# Altium footprint library Tienanh.PcbLib: 190 footprints (part 7 of 12)
Each footprint in its own frame and in the unit in brackets; x right, y up, seen from the top. Pads: shape width x height; smd on the part's side, far side on the other; paste and mask are expansions set on the pad; w line width, h text height; cw(c..) or ccw(c..) is an arc to the next point about the centre after c.
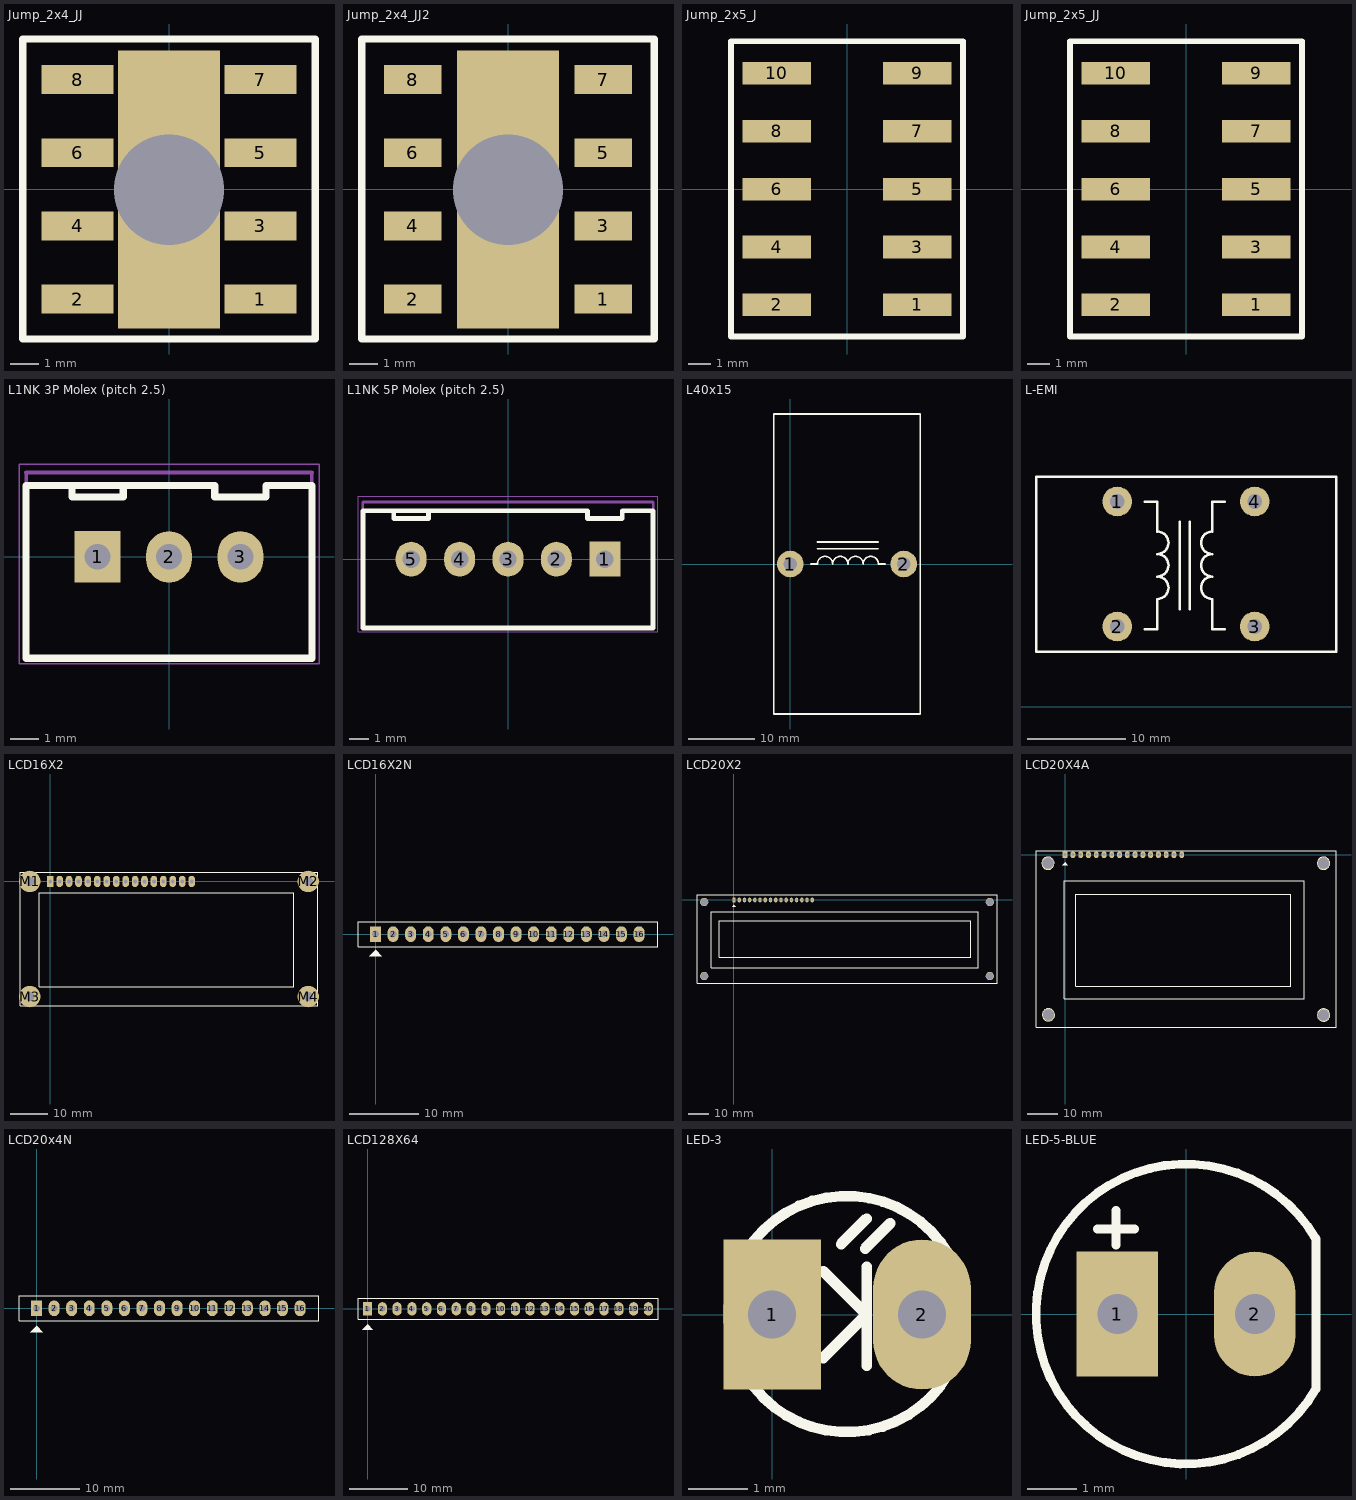
[diagram p6: the footprints below, top view; thin cyan lines are the x and y axes]

## Jump_2x4_JJ [mm]
pads (9):
  rect 2.5x1 smd: 1(3.175,-3.81) 2(-3.175,-3.81) 3(3.175,-1.27) 4(-3.175,-1.27) 5(3.175,1.27) 6(-3.175,1.27) 7(3.175,3.81) 8(-3.175,3.81)
  rect 3.556x9.652 hole 3.835 square: ""(0,-0.006)
Top Overlay:
  lines w0.254: -5.08,-5.194 5.08,-5.194 5.08,5.22 -5.08,5.22 -5.08,-5.194
3D body "BG180-08-A-0-N-C.stp": height 7.51, standoff 0.01, extent -3.4,-5.086 3.4,5.074

## Jump_2x4_JJ2 [mm]
pads (9):
  rect 2x1 smd: 1(3.302,-3.81) 2(-3.302,-3.81) 3(3.302,-1.27) 4(-3.302,-1.27) 5(3.302,1.27) 6(-3.302,1.27) 7(3.302,3.81) 8(-3.302,3.81)
  rect 3.556x9.652 hole 3.835 square: ""(0,-0.006)
Top Overlay:
  lines w0.254: -5.08,-5.194 -5.08,5.22 5.08,5.22 5.08,-5.194 -5.08,-5.194
3D body "BG180-08-A-0-N-C.stp": height 7.51, standoff 0.01, extent -3.4,-5.086 3.4,5.074

## Jump_2x5_J [mm]
pads (10):
  rect 3x1 smd: 1(3.073,-5.077) 2(-3.073,-5.077) 3(3.073,-2.543) 4(-3.073,-2.543) 5(3.073,-0.01) 6(-3.073,-0.01) 7(3.073,2.53) 8(-3.073,2.53) 9(3.073,5.077) 10(-3.073,5.077)
Top Overlay:
  lines w0.254: -5.08,-6.461 5.08,-6.461 5.08,6.474 -5.08,6.474 -5.08,-6.461
3D body "BG050-10A-0-1500-0737-0350-L-B.stp": height 18.51, standoff 0.01, extent -3.685,-6.353 3.685,6.347

## Jump_2x5_JJ [mm]
pads (10):
  rect 3x1 smd: 1(3.073,-5.077) 2(-3.073,-5.077) 3(3.073,-2.543) 4(-3.073,-2.543) 5(3.073,-0.01) 6(-3.073,-0.01) 7(3.073,2.53) 8(-3.073,2.53) 9(3.073,5.077) 10(-3.073,5.077)
Top Overlay:
  lines w0.254: -5.08,-6.461 5.08,-6.461 5.08,6.474 -5.08,6.474 -5.08,-6.461
3D body "BG180-10-A-0-N-C.stp": height 7.51, standoff 0.01, extent -3.371,-6.353 3.429,6.347

## L1NK 3P Molex (pitch 2.5) [mm]
pads (3):
  rect 1.6x1.8 hole 0.9: 1(-2.5,0)
  oval 1.6x1.8 hole 0.9: 2(0,0) 3(2.5,0)
Top Overlay:
  lines w0.25: -4.1,2.5 1.6,2.5 1.6,2.1 3.4,2.1 3.4,2.5 5,2.5 5,-3.55 -5,-3.55 -5,2.5 -3.4,2.5 -3.4,2.1 -1.6,2.1 -1.6,2.5
Mechanical 13:
  lines w0.127: -5,-3.55 -5,2.95 ; 5,-3.55 5,2.95
  lines w0.15: -5,-3.55 5,-3.55 ; -5,2.95 5,2.95
Mechanical 15:
  lines w0.05: -5.25,-3.75 -5.25,3.25 5.25,3.25 5.25,-3.75 -5.25,-3.75
3D body "x8821wv-03l-n0sn.stp": height 7.2, standoff -3.4, extent -5,-3.554 5,2.95

## L1NK 5P Molex (pitch 2.5) [mm]
pads (5):
  rect 1.6x1.8 hole 0.9: 1(5,0)
  oval 1.6x1.8 hole 0.9: 2(2.5,0) 3(0,0) 4(-2.5,0) 5(-5,0)
Top Overlay:
  lines w0.25: -6.6,2.5 4.1,2.5 4.1,2.1 5.9,2.1 5.9,2.5 7.5,2.5 7.5,-3.55 -7.5,-3.55 -7.5,2.5 -5.9,2.5 -5.9,2.1 -4.1,2.1 -4.1,2.5
Mechanical 13:
  lines w0.127: -7.5,-3.55 -7.5,2.95 ; 7.5,-3.55 7.5,2.95
  lines w0.15: -7.5,-3.55 7.5,-3.55 ; -7.5,2.95 7.5,2.95
Mechanical 15:
  lines w0.05: 7.75,-3.75 7.75,3.25 -7.75,3.25 -7.75,-3.75 7.75,-3.75 ; 7.75,-3.75 7.75,-3.75
3D body "x8821wv-05l-n0sn.stp": height 2.8, standoff -7.8, extent -7.5,-3.55 7.5,2.954

## L40x15 [mm]
pads (2):
  round 4 hole 2: 1(0,0) 2(17.018,0)
Top Overlay:
  lines w0.254: 3.048,0 4.064,0 cw(c5.207,0) 6.35,0 cw(c7.493,0) 8.636,0 cw(c9.779,0) 10.922,0 cw(c12.065,0) 13.208,0 14.224,0 ; 4.064,2.286 13.208,2.286 ; 4.064,3.302 13.208,3.302 ; -2.5,-22.5 19.5,-22.5 19.5,22.5 -2.5,22.5 -2.5,-22.5

## L-EMI [mm]
pads (4):
  round 3 hole 1.5: 1(12.7,20.828) 2(12.7,8.128) 3(26.67,8.128) 4(26.67,20.828)
Top Overlay:
  lines w0.254: 15.494,7.874 16.764,7.874 16.764,10.922 ccw(c16.764,12.065) 16.764,13.208 ccw(c16.764,14.351) 16.764,15.494 ccw(c16.764,16.637) 16.764,17.78 16.764,20.828 15.494,20.828 ; 19.05,9.906 19.05,18.796 ; 20.066,9.906 20.066,18.796 ; 23.622,7.874 22.352,7.874 22.352,10.922 cw(c22.352,12.065) 22.352,13.208 cw(c22.352,14.351) 22.352,15.494 cw(c22.352,16.637) 22.352,17.78 22.352,20.828 23.622,20.828 ; 4.445,5.588 34.925,5.588 34.925,23.368 4.445,23.368 4.445,5.588

## LCD16X2 [mm] "LCD dipslay 16x2, 16 pin"
height 10.16
pads (20):
  rect 1.778x3.048 hole 1: 1(0,0)
  oval 1.778x3.048 hole 1: 2(2.54,0) 3(5.08,0) 4(7.62,0) 5(10.16,0) 6(12.7,0) 7(15.24,0) 8(17.78,0) 9(20.32,0) 10(22.86,0) 11(25.4,0) 12(27.94,0) 13(30.48,0) 14(33.02,0) 15(35.56,0) 16(38.1,0)
  round 5.8 / inner round 0 / far side round 0 hole 2.5 unplated: M1(-5.5,0) M2(69.5,0) M3(-5.5,-31) M4(69.5,-31)
Top Overlay:
  lines w0.2: -8,-33.5 -8,2.5 72,2.5 72,-33.5 -8,-33.5 ; -2.921,-28.423 -2.921,-3.023 65.659,-3.023 65.659,-28.423 -2.921,-28.423
3D body "socket16.stp": height 7.02, standoff -2.98, extent -1.207,-1.333 39.433,1.207
3D body "jp16.stp": height 11.89, standoff -0.51, extent -1.219,-1.321 39.321,1.179
3D body "LCD module 16 X 2 backlight.STEP": height 18.14, standoff 4.93, extent -8.128,-34.468 72.372,2.032

## LCD16X2N [mil] "LCD dipslay 16x2, 16 pin"
height 400
pads (16):
  rect 62x90 hole 39: 1(0,0)
  oval 62x90 hole 39: 2(100,0) 3(200,0) 4(300,0) 5(400,0) 6(500,0) 7(600,0) 8(700,0) 9(800,0) 10(900,0) 11(1000,0) 12(1100,0) 13(1200,0) 14(1300,0) 15(1400,0) 16(1500,0)
Top Overlay:
  region: 0,-90 -35,-125 35,-125
  lines w7: -100,-71 -100,70 1608,70 1608,-71 -100,-71
3D body "socket16.stp": height 276.19, standoff -117.51, extent -49,-49 1551,51
3D body "jp16.stp": height 468.11, standoff -20.08, extent -48.03,-48.43 1548.03,50
3D body "lcd16.STEP": height 764, standoff 244, extent -319.64,-1353.49 2849.65,83.51

## LCD20X2 [mil] "LCD dipslay 20x2, 16 pin"
height 400
pads (20):
  rect 62x90 hole 36: 1(0,0)
  oval 62x90 hole 36: 2(100,0) 3(200,0) 4(300,0) 5(400,0) 6(500,0) 7(600,0) 8(700,0) 9(800,0) 10(900,0) 11(1000,0) 12(1100,0) 13(1200,0) 14(1300,0) 15(1400,0) 16(1500,0)
  round 157.48 hole 137.8: "Hole 0"(-570.87,-1456.69) "Hole 0"(-570.87,-39.37) "Hole 0"(4901.57,-1456.69) "Hole 0"(4901.57,-39.37)
Top Overlay:
  region: 0,-90 -35,-125 35,-125
  lines w7: -708.66,-1594.49 -708.66,100 5039.37,100 5039.37,-1594.49 -708.66,-1594.49 ; -436,-1300 -436,-225 4682,-225 4682,-1300 -436,-1300 ; -286,-1100 -286,-400 4532,-400 4532,-1100 -286,-1100
3D body "SW3dPS-Display20x2.STEP": height 198, standoff -180, extent -100,-1437 4470,33

## LCD20X4A [mil] "LCD dipslay 20x4, 16 pin"
height 400
pads (20):
  rect 62x90 hole 39: 1(0,0)
  oval 62x90 hole 39: 2(100,0) 3(200,0) 4(300,0) 5(400,0) 6(500,0) 7(600,0) 8(700,0) 9(800,0) 10(900,0) 11(1000,0) 12(1100,0) 13(1200,0) 14(1300,0) 15(1400,0) 16(1500,0)
  round 157.48 hole 137.8: "Hole 0"(-220,-110) "Hole 0"(-215,-2060) "Hole 0"(3325,-2065) "Hole 0"(3325,-110)
Top Overlay:
  circle w7: c3324.94,-2063 r79.06
  circle w7: c3324.94,-110 r79.06
  circle w7: c-221.06,-110 r79.06
  circle w7: c-215.06,-2061 r79.06
  region: 0,-100 -35,-135 35,-135
  lines w7: -375,-2220 -375,50 3485,50 3485,-2220 -374,-2220 ; -11,-1852 -11,-337 3076,-337 3076,-1852 -11,-1852 ; 139,-1695 139,-512 2905,-512 2905,-1695 139,-1695
3D body "User Library-LCD20_4.STEP": height 417.32, standoff -125.98, extent -392.13,-2264.2 3466.13,98

## LCD20x4N [mil] "LCD dipslay 20x4, 16 pin"
height 400
pads (16):
  rect 62x90 hole 39: 1(0,0)
  oval 62x90 hole 39: 2(100,0) 3(200,0) 4(300,0) 5(400,0) 6(500,0) 7(600,0) 8(700,0) 9(800,0) 10(900,0) 11(1000,0) 12(1100,0) 13(1200,0) 14(1300,0) 15(1400,0) 16(1500,0)
Top Overlay:
  region: 0,-100 -35,-135 35,-135
  lines w7: -100,-71 1608,-71 1608,70 -100,70 -100,-71
3D body "User Library-LCD20_4.STEP": height 417.32, standoff -125.98, extent -392,-2265.2 3466.27,97

## LCD128X64 [mil] "LCD Graphic 128x64, 20 pin"
height 400
pads (20):
  rect 62x90 hole 39: 1(0,0)
  oval 62x90 hole 39: 2(100,0) 3(200,0) 4(300,0) 5(400,0) 6(500,0) 7(600,0) 8(700,0) 9(800,0) 10(900,0) 11(1000,0) 12(1100,0) 13(1200,0) 14(1300,0) 15(1400,0) 16(1500,0) 17(1600,0) 18(1700,0) 19(1800,0) 20(1900,0)
Top Overlay:
  region: 0,-105 -35,-140 35,-140
  lines w7: -65,-71 -65,70 1965,70 1965,-71 -65,-71
3D body "User Library-GRAPHIC LCD WG12864B.STEP": height 475.59, standoff -130.71, extent -612.8,-2069.98 2536.8,56

## LED-3 [mil] "LED 2 PIN, 3ly Only colour"
height 300
pads (2):
  rect 65x100 hole 32: 1(0,0)
  oval 65x100 hole 32: 2(100,0)
Top Overlay:
  lines w7: 34,-29 63,0 34,29 ; 46,47 63,64 ; 62,44 79,61 ; 63,-34 63,32 ; 117.92,-39.35 117.92,39.84
  lines w7.01: 117.57,-39.74 cw(c49.8,0.35) 117.72,40.19
3D body "SW3DPS-LED DIP 3MM-DEFAULT.STEP": height 217.14, standoff -117.51, extent -24.8,-74.81 112.99,74.8

## LED-5-BLUE [mil] "LED 2 PIN, 5 ly , Only colour, pin to pin 110mil"
height 300
pads (2):
  rect 65x100 hole 32: 1(-55,0)
  oval 65x100 hole 32: 2(55,0)
Top Overlay:
  lines w7: -71,68 -41,68 ; -56,55 -56,83 ; 103.51,60.71 ccw(c0,0) 103.94,-59.97 ; 104,-59 104,60
3D body "User Library-LEDd5B.STEP": height 339.18, standoff -243.49, extent -113.31,-120.49 100.08,116.5